# Altium footprint library PcbLib1.PcbLib: 148 footprints (part 4 of 10)
Each footprint in its own frame and in the unit in brackets; x right, y up, seen from the top. Pads: shape width x height; smd on the part's side, far side on the other; paste and mask are expansions set on the pad; w line width, h text height; cw(c..) or ccw(c..) is an arc to the next point about the centre after c.
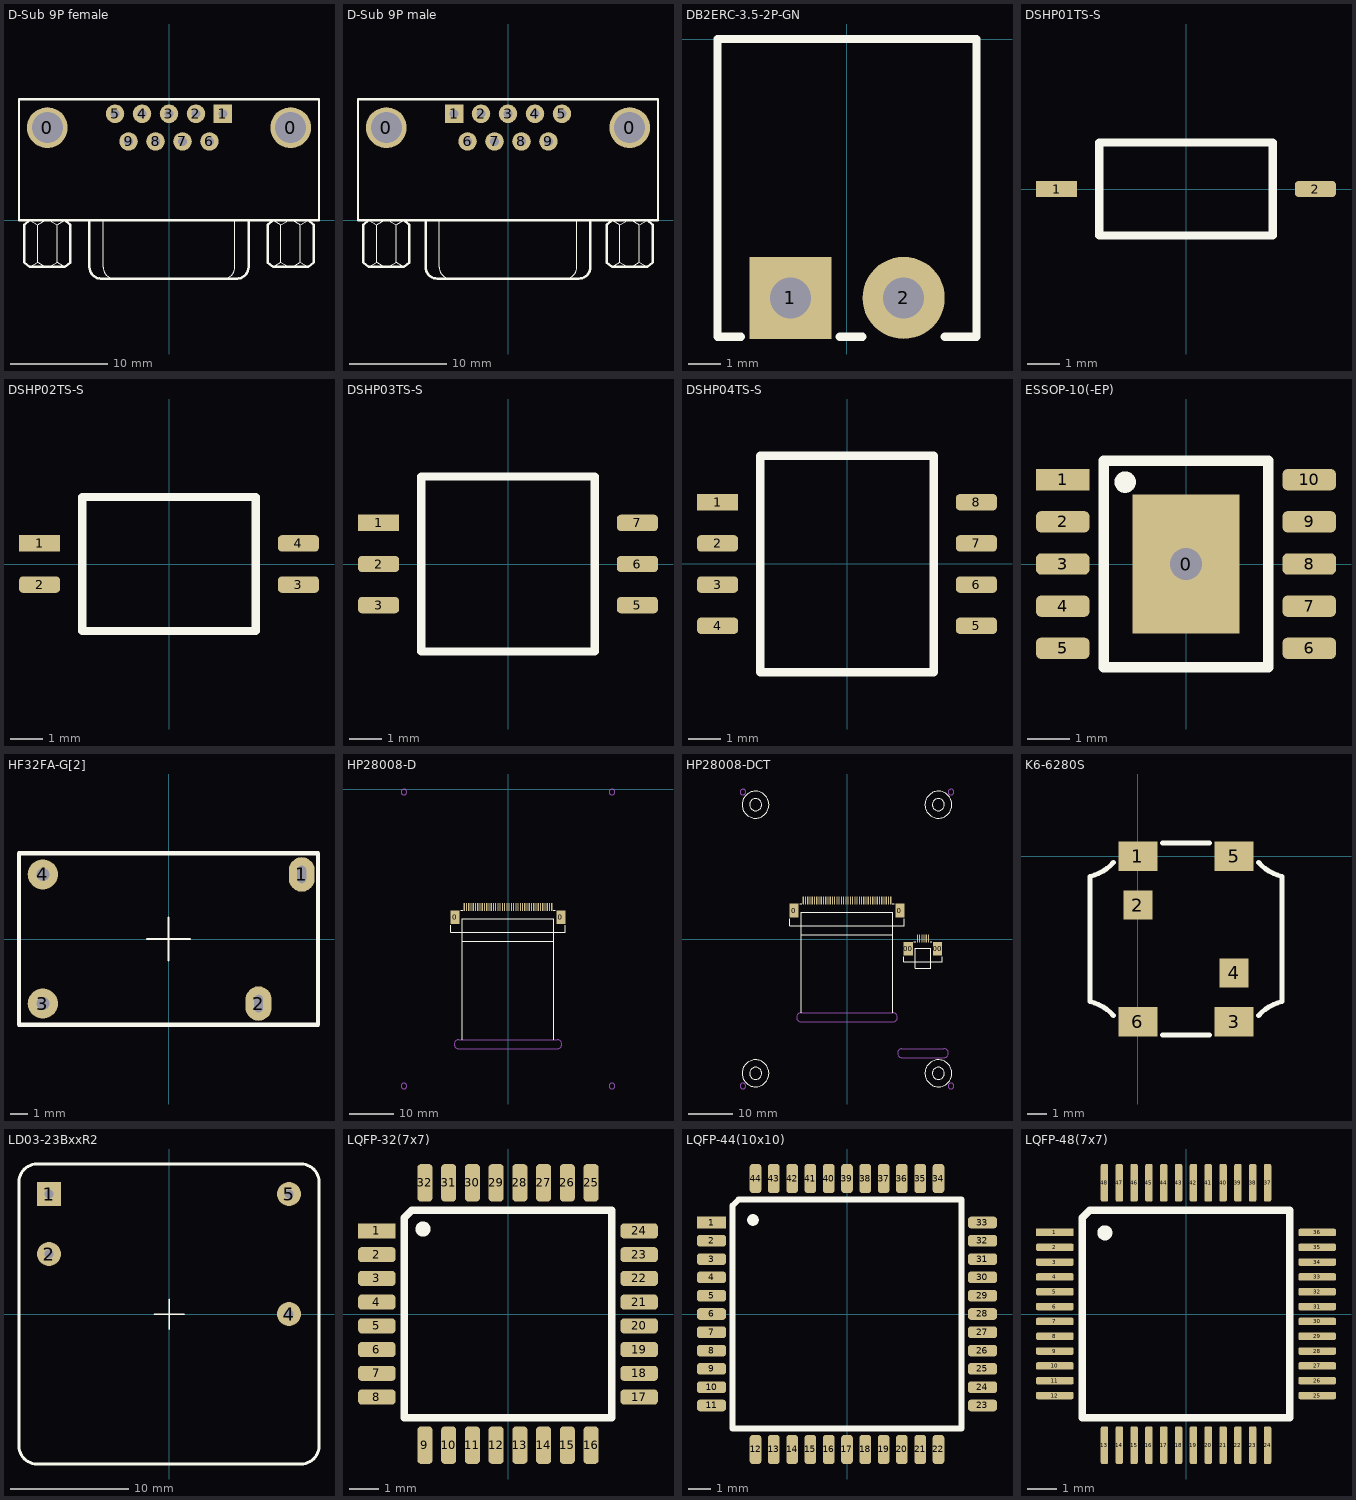
[diagram p3: the footprints below, top view; thin cyan lines are the x and y axes]

## D-Sub 9P female [mm] "Ckmtw(灿科盟) D-DMR009PF-D002(C141882)"
pads (11):
  round 4.191 hole 3.175: 0(-12.495,9.5) 0(12.495,9.5)
  rect 1.905x1.905 hole 0.889: 1(5.54,10.92)
  round 1.905 hole 0.889: 2(2.77,10.92) 3(0,10.92) 4(-2.77,10.92) 5(-5.54,10.92) 6(4.155,8.08) 7(1.385,8.08) 8(-1.385,8.08) 9(-4.155,8.08)
Top Overlay:
  lines w0.127: -14.291,-4.8 -13.499,-4.325 ; -14.291,0 -13.499,-0.475 ; -12.707,-4.8 -13.499,-4.325 ; -12.707,0 -13.499,-0.475 ; -12.283,-4.8 -11.491,-4.325 ; -12.283,0 -11.491,-0.475 ; -10.699,-4.8 -11.491,-4.325 ; -10.699,0 -11.491,-0.475 ; -6.772,-4.824 ccw(c-5.596,-4.824) -5.596,-6 ; -6.772,-4.824 -6.772,0 ; 5.596,-6 ccw(c5.596,-4.824) 6.772,-4.824 ; 6.772,-4.824 6.772,0 ; 10.699,-4.8 11.491,-4.325 ; 10.699,0 11.491,-0.475 ; 12.283,-4.8 11.491,-4.325 ; 12.283,0 11.491,-0.475 ; 12.707,-4.8 13.499,-4.325 ; 12.707,0 13.499,-0.475 ; 14.291,-4.8 13.499,-4.325 ; 14.291,0 13.499,-0.475 ; -13.499,-4.325 -13.499,-0.475 ; -11.491,-4.325 -11.491,-0.475 ; 11.491,-4.325 11.491,-0.475 ; 13.499,-4.325 13.499,-0.475
  lines w0.254: -14.291,-4.8 -10.699,-4.8 ; -14.291,-4.8 -14.87,-4.325 -14.87,-0.475 -14.291,0 ; -10.699,-4.8 -10.12,-4.325 -10.12,-0.475 -10.699,0 ; -8.165,0 -8.165,-4.824 ccw(c-6.989,-4.824) -6.989,-6 6.989,-6 ccw(c6.989,-4.824) 8.165,-4.824 8.165,0 ; 10.699,-4.8 14.291,-4.8 ; 10.699,-4.8 10.12,-4.325 10.12,-0.475 10.699,0 ; 14.291,-4.8 14.87,-4.325 14.87,-0.475 14.291,0 ; -15.4,0 15.4,0 15.4,12.4 -15.4,12.4 -15.4,0

## D-Sub 9P male [mm] "Ckmtw(灿科盟) D-DMR009PM-D002(C141880)"
pads (11):
  round 4.191 hole 3.175: 0(-12.495,9.5) 0(12.495,9.5)
  rect 1.905x1.905 hole 0.889: 1(-5.54,10.92)
  round 1.905 hole 0.889: 2(-2.77,10.92) 3(0,10.92) 4(2.77,10.92) 5(5.54,10.92) 6(-4.155,8.08) 7(-1.385,8.08) 8(1.385,8.08) 9(4.155,8.08)
Top Overlay:
  lines w0.127: -14.291,-4.8 -13.499,-4.325 ; -14.291,0 -13.499,-0.475 ; -12.707,-4.8 -13.499,-4.325 ; -12.707,0 -13.499,-0.475 ; -12.283,-4.8 -11.491,-4.325 ; -12.283,0 -11.491,-0.475 ; -10.699,-4.8 -11.491,-4.325 ; -10.699,0 -11.491,-0.475 ; -7.067,0 -7.067,-4.824 ccw(c-5.891,-4.824) -5.891,-6 ; 5.891,-6 ccw(c5.891,-4.824) 7.067,-4.824 7.067,0 ; 10.699,-4.8 11.491,-4.325 ; 10.699,0 11.491,-0.475 ; 12.283,-4.8 11.491,-4.325 ; 12.283,0 11.491,-0.475 ; 12.707,-4.8 13.499,-4.325 ; 12.707,0 13.499,-0.475 ; 14.291,-4.8 13.499,-4.325 ; 14.291,0 13.499,-0.475 ; -13.499,-4.325 -13.499,-0.475 ; -11.491,-4.325 -11.491,-0.475 ; 11.491,-4.325 11.491,-0.475 ; 13.499,-4.325 13.499,-0.475
  lines w0.254: -14.291,-4.8 -10.699,-4.8 ; -14.291,-4.8 -14.87,-4.325 -14.87,-0.475 -14.291,0 ; -10.699,-4.8 -10.12,-4.325 -10.12,-0.475 -10.699,0 ; -8.46,0 -8.46,-4.824 ccw(c-7.284,-4.824) -7.284,-6 7.284,-6 ccw(c7.284,-4.824) 8.46,-4.824 8.46,0 ; 10.699,-4.8 14.291,-4.8 ; 10.699,-4.8 10.12,-4.325 10.12,-0.475 10.699,0 ; 14.291,-4.8 14.87,-4.325 14.87,-0.475 14.291,0 ; -15.4,0 15.4,0 15.4,12.4 -15.4,12.4 -15.4,0

## DB2ERC-3.5-2P-GN [mm]
pads (2):
  rect 2.54x2.54 hole 1.27: 1(-1.75,-8)
  round 2.54 hole 1.27: 2(1.75,-8)
Top Overlay:
  lines w0.254: -3.274,-9.2 -4,-9.2 -4,0 4,0 4,-9.2 3.02,-9.2 ; -0.226,-9.2 0.48,-9.2

## DSHP01TS-S [mil]
pads (2):
  rect 50x20 smd: 1(-157.32,0)
  rrect50% 50x20 smd: 2(157.32,0)
Top Overlay:
  lines w10: -105.31,-56.5 105.32,-56.5 105.31,56.5 -105.31,56.5 -105.32,-56.5
3D body "DSHP01TS-S.stp": height 94.49, standoff 0, extent -167.32,-56.5 167.32,56.5

## DSHP02TS-S [mil]
pads (4):
  rect 50x20 smd: 1(-157.32,25)
  rrect50% 50x20 smd: 2(-157.32,-25) 3(157.32,-25) 4(157.32,25)
Top Overlay:
  lines w10: -105.32,-81.5 105.31,-81.5 105.31,81.5 -105.31,81.5 -105.32,-81.5
3D body "DSHP02TS-S.stp": height 94.49, standoff 0, extent -167.32,-81.5 167.32,81.5

## DSHP03TS-S [mil]
pads (6):
  rect 50x20 smd: 1(-157.32,50)
  rrect50% 50x20 smd: 2(-157.32,0) 3(-157.32,-50) 5(157.32,-50) 6(157.32,0) 7(157.32,50)
Top Overlay:
  lines w10: -105.31,-106.5 105.32,-106.5 105.31,106.5 -105.31,106.5 -105.31,-106.5
3D body "DSHP03TS-S.stp": height 94.49, standoff 0, extent -167.32,-106.5 167.32,106.5

## DSHP04TS-S [mil]
pads (8):
  rect 50x20 smd: 1(-157.32,75)
  rrect50% 50x20 smd: 2(-157.32,25) 3(-157.32,-25) 4(-157.32,-75) 5(157.32,-75) 6(157.32,-25) 7(157.32,25) 8(157.32,75)
Top Overlay:
  lines w10: -105.32,-131.5 -105.31,131.5 105.31,131.5 105.32,-131.5 -105.31,-131.5
3D body "DSHP04TS-S.stp": height 94.49, standoff 0, extent -167.32,-131.5 167.32,131.5

## ESSOP-10(-EP) [mil]
pads (11):
  rect 100x130 smd: 0(0,0)
  rect 50x20 smd: 1(-115.11,78.74)
  rrect50% 50x20 smd: 2(-115.11,39.37) 3(-115.11,0) 4(-115.11,-39.37) 5(-115.11,-78.74) 6(115.11,-78.74) 7(115.11,-39.37) 8(115.11,0) 9(115.11,39.37) 10(115.11,78.74)
via 0,0 diameter 40 hole 30
Top Overlay:
  circle w10: c-56.77,76.46 r5
  lines w10: -76.77,-96.46 76.77,-96.46 76.77,96.46 -76.77,96.46 -76.77,-96.46

## HF32FA-G[2] [mil]
pads (4):
  oval 60x80 hole 20 slot 40 at 90 deg: 1(308.66,149.61) 2(208.66,-149.61)
  round 70 hole 30: 3(-291.34,-149.61) 4(-291.34,149.61)
Top Overlay:
  lines w5: -50,0 50,0 ; 0,-50 0,50
  lines w10: -346.46,-198.82 346.46,-198.82 346.46,198.82 -346.46,198.82 -346.46,-198.82
3D body "HF32FA-G[2].stp": height 500.57, standoff -141.53, extent -347.48,-198.82 345.43,198.82

## HP28008-D [mil] "耀元鸿科技2.8英寸IPS 240x320 ST7789V"
pads (42):
  rect 80x120 smd: 0(-463.94,-1126.93) 0(463.94,-1126.93)
  rect 10x70 smd: 1(383.86,-1037.56)
  rrect50% 10x70 smd: 2(364.17,-1037.56) 3(344.49,-1037.56) 4(324.8,-1037.56) 5(305.12,-1037.56) 6(285.43,-1037.56) 7(265.75,-1037.56) 8(246.06,-1037.56) 9(226.38,-1037.56) 10(206.69,-1037.56) 11(187.01,-1037.56) 12(167.32,-1037.56) 13(147.64,-1037.56) 14(127.95,-1037.56) 15(108.27,-1037.56) 16(88.58,-1037.56) 17(68.9,-1037.56) 18(49.21,-1037.56) 19(29.53,-1037.56) 20(9.84,-1037.56) 21(-9.84,-1037.56) 22(-29.53,-1037.56) 23(-49.21,-1037.56) 24(-68.9,-1037.56) 25(-88.58,-1037.56) 26(-108.27,-1037.56) 27(-127.95,-1037.56) 28(-147.64,-1037.56) 29(-167.32,-1037.56) 30(-187.01,-1037.56) 31(-206.69,-1037.56) 32(-226.38,-1037.56) 33(-246.06,-1037.56) 34(-265.75,-1037.56) 35(-285.43,-1037.56) 36(-305.12,-1037.56) 37(-324.8,-1037.56) 38(-344.49,-1037.56) 39(-364.17,-1037.56) 40(-383.86,-1037.56)
Top Overlay:
  lines w10: -503.94,-1196.93 -503.94,-1259.84 503.94,-1259.84 503.94,-1196.93 ; -413.94,-1066.93 -398.86,-1066.93 ; -403.54,-2202.76 -403.54,-1141.73 403.54,-1141.73 403.54,-2202.76 ; -403.54,-1338.58 403.54,-1338.58 ; 398.86,-1066.93 413.94,-1066.93
Bottom Overlay:
  lines w5: -50,-1317.91 50,-1317.91 ; 0,-1367.91 0,-1267.91
  lines w10: -403.54,-2635.83 -403.54,-2281.5 ; 403.54,-2635.83 403.54,-2281.5 ; -940.94,-2635.83 940.94,-2635.83 940.94,0 -940.94,0 -940.94,-2635.83 ; -850.39,-2363.39 -850.39,-95.67 850.39,-95.67 850.39,-2363.39 -850.39,-2363.39
Mechanical 1:
  circle w10: c914.17,-2609.45 r25
  circle w10: c-914.17,-2609.45 r25
  circle w10: c914.17,-26.77 r25
  circle w10: c-914.17,-26.77 r25
  lines w10: -433.07,-2281.5 cw(c-433.07,-2242.13) -433.07,-2202.76 433.07,-2202.76 cw(c433.07,-2242.13) 433.07,-2281.5 -433.07,-2281.5
3D body "X05B20U40T.stp": height 78.74, standoff 0, extent -503.94,-1259.84 503.94,-1024.8

## HP28008-DCT [mil] "耀元鸿科技2.8英寸显示屏(HP28008-D)+电容触摸(ML2071GFF2.8-V0)总成"
pads (50):
  rect 80x120 smd: 0(-463.94,250.04) 0(463.94,250.04) 00(538.03,-85) 00(796.61,-85)
  rect 10x70 smd: 1(383.86,339.41) 01(716.53,4.37)
  rrect50% 10x70 smd: 2(364.17,339.41) 02(696.85,4.37) 3(344.49,339.41) 03(677.16,4.37) 4(324.8,339.41) 04(657.48,4.37) 5(305.12,339.41) 05(637.79,4.37) 6(285.43,339.41) 06(618.11,4.37) 7(265.75,339.41) 8(246.06,339.41) 9(226.38,339.41) 10(206.69,339.41) 11(187.01,339.41) 12(167.32,339.41) 13(147.64,339.41) 14(127.95,339.41) 15(108.27,339.41) 16(88.58,339.41) 17(68.9,339.41) 18(49.21,339.41) 19(29.53,339.41) 20(9.84,339.41) 21(-9.84,339.41) 22(-29.53,339.41) 23(-49.21,339.41) 24(-68.9,339.41) 25(-88.58,339.41) 26(-108.27,339.41) 27(-127.95,339.41) 28(-147.64,339.41) 29(-167.32,339.41) 30(-187.01,339.41) 31(-206.69,339.41) 32(-226.38,339.41) 33(-246.06,339.41) 34(-265.75,339.41) 35(-285.43,339.41) 36(-305.12,339.41) 37(-324.8,339.41) 38(-344.49,339.41) 39(-364.17,339.41) 40(-383.86,339.41)
Top Overlay:
  circle w10: c803.15,-1180.12 r53.15
  circle w10: c803.15,-1180.12 r118.11
  circle w10: c803.15,1180.12 r53.15
  circle w10: c803.15,1180.12 r118.11
  circle w10: c-803.15,1180.12 r53.15
  circle w10: c-803.15,1180.12 r118.11
  circle w10: c-803.15,-1180.12 r53.15
  circle w10: c-803.15,-1180.12 r118.11
  lines w10: -503.94,180.04 -503.94,117.13 503.94,117.13 503.94,180.04 ; -413.94,310.04 -398.86,310.04 ; -403.54,-648.62 -403.54,235.24 403.54,235.24 403.54,-648.62 ; -403.54,38.39 403.54,38.39 ; 398.86,310.04 413.94,310.04 ; 498.03,-155 498.03,-198.23 836.61,-198.23 836.61,-155 ; 588.03,-25 603.11,-25 ; 731.53,-25 746.61,-25 ; 598.43,-257.28 598.43,-80.12 736.22,-80.12 736.22,-257.28 598.43,-257.28
Bottom Overlay:
  lines w5: -50,0 50,0 ; 0,-50 0,50
  lines w10: -403.54,-1317.91 -403.54,-727.36 ; 403.54,-1317.91 403.54,-727.36 ; -940.94,-1317.91 940.94,-1317.91 940.94,1317.91 -940.94,1317.91 -940.94,-1317.91 ; -850.39,-1045.47 -850.39,1222.24 850.39,1222.24 850.39,-1045.47 -850.39,-1045.47
Mechanical 1:
  circle w10: c914.17,-1291.54 r25
  circle w10: c-914.17,-1291.54 r25
  circle w10: c914.17,1291.14 r25
  circle w10: c-914.17,1291.14 r25
  lines w10: -403.54,-727.36 cw(c-403.54,-687.99) -403.54,-648.62 403.54,-648.62 cw(c403.54,-687.99) 403.54,-727.36 -403.54,-727.36 ; 483.07,-1042.32 cw(c483.07,-1002.95) 483.07,-963.58 851.57,-963.58 cw(c851.57,-1002.95) 851.57,-1042.32 483.07,-1042.32
3D body "X05B20U40T.stp": height 78.74, standoff 0, extent -503.94,117.13 503.94,352.17
3D body "X05B20L06T.stp": height 78.74, standoff 0, extent 498.03,-198.23 836.61,10.43

## K6-6280S [mil]
pads (6):
  rect 80x60 smd: 1(0,0) 3(196.85,-338.9) 5(196.85,0) 6(0,-338.9)
  rect 60x60 smd: 2(0,-100) 4(196.85,-238.9)
Top Overlay:
  lines w10: -50,-326.31 ccw(c-118.11,-385.98) -98.43,-297.6 -98.43,-41.3 ccw(c-118.11,47.09) -50,-12.58 ; 50,-366.3 146.85,-366.3 ; 50,27.4 146.85,27.4 ; 246.85,-326.31 cw(c314.96,-385.98) 295.28,-297.6 295.28,-41.3 cw(c314.96,47.09) 246.85,-12.58
3D body "K6-6280S.stp": height 157.48, standoff 0, extent -98.43,-366.3 295.28,27.4

## LD03-23BxxR2 [mil]
pads (4):
  rect 80x80 hole 30: 1(-400,400)
  round 80 hole 30: 2(-400,200) 4(400,0) 5(400,400)
Top Overlay:
  lines w5: -50,0 50,0 ; 0,-50 0,50
  lines w10: -500,-440 ccw(c-440,-440) -440,-500 440,-500 ccw(c440,-440) 500,-440 500,440 ccw(c440,440) 440,500 -440,500 ccw(c-440,440) -500,440 -500,-440
3D body "LD03-23BxxR2.stp": height 696.85, standoff -161.42, extent -500,-500 500,500

## LQFP-32(7x7) [mil]
pads (32):
  rect 50x20 smd mask+4: 1(-174.16,110.24)
  rrect50% 50x20 smd mask+4: 2(-174.16,78.74) 3(-174.16,47.24) 4(-174.16,15.75) 5(-174.16,-15.75) 6(-174.16,-47.24) 7(-174.16,-78.74) 8(-174.16,-110.24)
  rrect50% 20x50 smd: 9(-110.24,-174.16) 10(-78.74,-174.16) 11(-47.24,-174.16) 12(-15.75,-174.16) 13(15.75,-174.16) 14(47.24,-174.16) 15(78.74,-174.16) 16(110.23,-174.16) 25(110.23,174.16) 26(78.74,174.16) 27(47.24,174.16) 28(15.75,174.16) 29(-15.75,174.16) 30(-47.24,174.16) 31(-78.74,174.16) 32(-110.24,174.16)
  rrect50% 50x20 smd: 17(174.16,-110.24) 18(174.16,-78.74) 19(174.16,-47.24) 20(174.16,-15.75) 21(174.16,15.75) 22(174.16,47.24) 23(174.16,78.74) 24(174.16,110.24)
Top Overlay:
  circle w10: c-112.8,112.8 r5
  lines w10: -137.8,-137.8 137.79,-137.8 137.79,137.8 -127.8,137.8 -137.8,127.8 -137.8,-137.8
3D body "LQFP-32(7x7).step": height 63.11, standoff 0, extent -177.01,-177.01 177.01,177.01

## LQFP-44(10x10) [mil]
pads (44):
  rect 50x20 smd: 1(-233.22,157.48)
  rrect50% 50x20 smd: 2(-233.22,125.98) 3(-233.22,94.49) 4(-233.22,62.99) 5(-233.22,31.5) 6(-233.22,0) 7(-233.22,-31.5) 8(-233.22,-62.99) 9(-233.22,-94.49) 10(-233.22,-125.98) 11(-233.22,-157.48) 23(233.22,-157.48) 24(233.22,-125.98) 25(233.22,-94.49) 26(233.22,-62.99) 27(233.22,-31.5) 28(233.22,0) 29(233.22,31.5) 30(233.22,62.99) 31(233.22,94.49) 32(233.22,125.98) 33(233.22,157.48)
  rrect50% 20x50 smd: 12(-157.48,-233.22) 13(-125.98,-233.22) 14(-94.49,-233.22) 15(-62.99,-233.22) 16(-31.5,-233.22) 17(0,-233.22) 18(31.5,-233.22) 19(62.99,-233.22) 20(94.49,-233.22) 21(125.98,-233.22) 22(157.48,-233.22) 34(157.48,233.22) 35(125.98,233.22) 36(94.49,233.22) 37(62.99,233.22) 38(31.5,233.22) 39(0,233.22) 40(-31.5,233.22) 41(-62.99,233.22) 42(-94.49,233.22) 43(-125.98,233.22) 44(-157.48,233.22)
Top Overlay:
  circle w10: c-161.85,161.85 r5
  lines w10: -196.85,-196.85 -196.85,186.85 -186.85,196.85 196.85,196.85 196.85,-196.85 -196.85,-196.85
3D body "LQFP-44(10x10).step": height 63.11, standoff 0, extent -240,-240 240,240

## LQFP-48(7x7) [mil]
pads (48):
  rect 50x10 smd: 1(-174.16,108.27)
  rrect50% 50x10 smd: 2(-174.16,88.58) 3(-174.16,68.9) 4(-174.16,49.21) 5(-174.16,29.53) 6(-174.16,9.84) 7(-174.16,-9.84) 8(-174.16,-29.53) 9(-174.16,-49.21) 10(-174.16,-68.9) 11(-174.16,-88.58) 12(-174.16,-108.27) 25(174.16,-108.27) 26(174.16,-88.58) 27(174.16,-68.9) 28(174.16,-49.21) 29(174.16,-29.53) 30(174.16,-9.84) 31(174.16,9.84) 32(174.16,29.53) 33(174.16,49.21) 34(174.16,68.9) 35(174.16,88.58) 36(174.16,108.27)
  rrect50% 10x50 smd: 13(-108.27,-174.16) 14(-88.58,-174.16) 15(-68.9,-174.16) 16(-49.21,-174.16) 17(-29.53,-174.16) 18(-9.84,-174.16) 19(9.84,-174.16) 20(29.53,-174.16) 21(49.21,-174.16) 22(68.9,-174.16) 23(88.58,-174.16) 24(108.27,-174.16) 37(108.27,174.16) 38(88.58,174.16) 39(68.9,174.16) 40(49.21,174.16) 41(29.53,174.16) 42(9.84,174.16) 43(-9.84,174.16) 44(-29.53,174.16) 45(-49.21,174.16) 46(-68.9,174.16) 47(-88.58,174.16) 48(-108.27,174.16)
Top Overlay:
  circle w10: c-107.8,107.8 r5
  lines w10: -137.8,-137.8 137.8,-137.8 137.8,137.8 -127.8,137.8 -137.8,127.8 -137.8,-137.8
3D body "LQFP-48(7x7).step": height 63.11, standoff 0, extent -177.05,-177.05 177.05,177.05